# Altium schematic symbol library Regulator_Linear.SchLib: 1538 symbols (part 2 of 9) (continued)
## AZ1117-2.5 (continued)

## AZ1117-2.85
designator *  value AZ1117-2.85  Reference: U
ki_keywords: Fixed Voltage Regulator 1A Positive LDO; ki_description: 1A 20V Fixed LDO Linear Regulator, 2.85V, SOT-89/SOT-223/TO-220/TO-252/TO-263; ki_fp_filters: SOT?223* SOT?89* TO?220* TO?252* TO?263*; Datasheet: https://www.diodes.com/assets/Datasheets/AZ1117.pdf
pins: 1 GND, 2 VO, 3 VI

## AZ1117-3.3
designator *  value AZ1117-3.3  Reference: U
ki_keywords: Fixed Voltage Regulator 1A Positive LDO; ki_description: 1A 20V Fixed LDO Linear Regulator, 3.3V, SOT-89/SOT-223/TO-220/TO-252/TO-263; ki_fp_filters: SOT?223* SOT?89* TO?220* TO?252* TO?263*; Datasheet: https://www.diodes.com/assets/Datasheets/AZ1117.pdf
pins: 1 GND, 2 VO, 3 VI

## AZ1117-5.0
designator *  value AZ1117-5.0  Reference: U
ki_keywords: Fixed Voltage Regulator 1A Positive LDO; ki_description: 1A 20V Fixed LDO Linear Regulator, 5.0V, SOT-89/SOT-223/TO-220/TO-252/TO-263; ki_fp_filters: SOT?223* SOT?89* TO?220* TO?252* TO?263*; Datasheet: https://www.diodes.com/assets/Datasheets/AZ1117.pdf
pins: 1 GND, 2 VO, 3 VI

## AZ1117-ADJ
designator *  value AZ1117-ADJ  Reference: U
ki_keywords: Adjustable Voltage Regulator 1A Positive LDO; ki_description: 1A 20V Adjustable LDO Linear Regulator, SOT-89/SOT-223/TO-220/TO-252/TO-263; ki_fp_filters: SOT?223* SOT?89* TO?220* TO?252* TO?263*; Datasheet: https://www.diodes.com/assets/Datasheets/AZ1117.pdf
pins: 1 ADJ, 2 VO, 3 VI

## AZ1117D-ADJ
designator *  value AZ1117D-ADJ  Reference: U
ki_keywords: Adjustable Voltage Regulator 1A Positive LDO; ki_description: 1A 20V Adjustable LDO Linear Regulator, TO-252; ki_fp_filters: TO?252*; Footprint: Package_TO_SOT_SMD:TO-252-2; Datasheet: https://www.diodes.com/assets/Datasheets/products_inactive_data/AZ1117.pdf
pins: 1 ADJ, 2 VO, 3 VI

## AZ1117H-ADJ
designator *  value AZ1117H-ADJ  Reference: U
ki_keywords: Adjustable Voltage Regulator 1A Positive LDO; ki_description: 1A 20V Adjustable LDO Linear Regulator, SOT-223; ki_fp_filters: SOT?223*TabPin2*; Footprint: Package_TO_SOT_SMD:SOT-223-3_TabPin2; Datasheet: https://www.diodes.com/assets/Datasheets/products_inactive_data/AZ1117.pdf
pins: 1 ADJ, 2 VO, 3 VI

## AZ1117R-ADJ
designator *  value AZ1117R-ADJ  Reference: U
ki_keywords: Adjustable Voltage Regulator 1A Positive LDO; ki_description: 1A 20V Adjustable LDO Linear Regulator, SOT-89; ki_fp_filters: SOT?89*; Footprint: Package_TO_SOT_SMD:SOT-89-3; Datasheet: https://www.diodes.com/assets/Datasheets/products_inactive_data/AZ1117.pdf
pins: 1 ADJ, 2 VO, 3 VI

## AZ1117S-ADJ
designator *  value AZ1117S-ADJ  Reference: U
ki_keywords: Adjustable Voltage Regulator 1A Positive LDO; ki_description: 1A 20V Adjustable LDO Linear Regulator, TO-263; ki_fp_filters: TO?263*; Footprint: Package_TO_SOT_SMD:TO-263-2; Datasheet: https://www.diodes.com/assets/Datasheets/products_inactive_data/AZ1117.pdf
pins: 1 ADJ, 2 VO, 3 VI

## AZ1117T-ADJ
designator *  value AZ1117T-ADJ  Reference: U
ki_keywords: Adjustable Voltage Regulator 1A Positive LDO; ki_description: 1A 20V Adjustable LDO Linear Regulator, TO-220; ki_fp_filters: TO?220*; Footprint: Package_TO_SOT_THT:TO-220-3_Vertical; Datasheet: https://www.diodes.com/assets/Datasheets/products_inactive_data/AZ1117.pdf
pins: 1 ADJ, 2 VO, 3 VI

## BD00FC0WEFJ
designator *  value BD00FC0WEFJ  Reference: U
ki_keywords: linear regulator variable positive over voltage protection thermal shutdown; ki_description: 1A, variable LDO regulator with OVP & TSP, with enable, HTSOP-J8; ki_fp_filters: HTSOP*1EP*3.9x4.9mm*P1.27mm*; Footprint: Package_SO:HTSOP-8-1EP_3.9x4.9mm_P1.27mm_EP2.4x3.2mm; Datasheet: https://fscdn.rohm.com/en/products/databook/datasheet/ic/power/linear_regulator/bdxxfc0wefj-e.pdf
pins: 1 VO, 2 FB, 3 GND, 4 NC hidden, 5 EN, 6 NC hidden, 7 NC hidden, 8 VCC, 9 GND hidden

## BD00FC0WFP
designator *  value BD00FC0WFP  Reference: U
ki_keywords: linear regulator variable positive over voltage protection thermal shutdown; ki_description: 1A, variable LDO regulator with OVP & TSP, with enable, TO-252; ki_fp_filters: TO?252*; Footprint: Package_TO_SOT_SMD:TO-252-4; Datasheet: https://fscdn.rohm.com/en/products/databook/datasheet/ic/power/linear_regulator/bdxxfc0wefj-e.pdf
pins: 1 EN, 2 VCC, 3 GND, 4 VO, 5 FB

## BD15GA3WEFJ
designator *  value BD15GA3WEFJ  Reference: U
ki_keywords: linear regulator fixed positive over voltage protection thermal shutdown; ki_description: 300mA, 1.5V LDO regulator with OVP & TSP, HTSOP-8; ki_fp_filters: HTSOP*1EP*3.9x4.9mm*P1.27mm*; Footprint: Package_SO:HTSOP-8-1EP_3.9x4.9mm_P1.27mm_EP2.4x3.2mm; Datasheet: http://rohmfs.rohm.com/en/products/databook/datasheet/ic/power/linear_regulator/bdxxga3wefj-e.pdf
pins: 1 VO, 2 Vo_s, 3 GND, 4 GND hidden, 5 EN, 6 GND hidden, 7 GND hidden, 8 VCC, 9 GND hidden

## BD15GA5WEFJ
designator *  value BD15GA5WEFJ  Reference: U
ki_keywords: linear regulator fixed positive over voltage protection thermal shutdown; ki_description: 500mA, 1.5V LDO regulator with OVP & TSP, HTSOP-8; ki_fp_filters: HTSOP*1EP*3.9x4.9mm*P1.27mm*; Footprint: Package_SO:HTSOP-8-1EP_3.9x4.9mm_P1.27mm_EP2.4x3.2mm; Datasheet: http://rohmfs.rohm.com/en/products/databook/datasheet/ic/power/linear_regulator/bdxxga5wefj-e.pdf
pins: 1 VO, 2 Vo_s, 3 GND, 4 GND hidden, 5 EN, 6 GND hidden, 7 GND hidden, 8 VCC, 9 GND hidden

## BD18GA3WEFJ
designator *  value BD18GA3WEFJ  Reference: U
ki_keywords: linear regulator fixed positive over voltage protection thermal shutdown; ki_description: 300mA, 1.8V LDO regulator with OVP & TSP, HTSOP-8; ki_fp_filters: HTSOP*1EP*3.9x4.9mm*P1.27mm*; Footprint: Package_SO:HTSOP-8-1EP_3.9x4.9mm_P1.27mm_EP2.4x3.2mm; Datasheet: http://rohmfs.rohm.com/en/products/databook/datasheet/ic/power/linear_regulator/bdxxga3wefj-e.pdf
pins: 1 VO, 2 Vo_s, 3 GND, 4 GND hidden, 5 EN, 6 GND hidden, 7 GND hidden, 8 VCC, 9 GND hidden

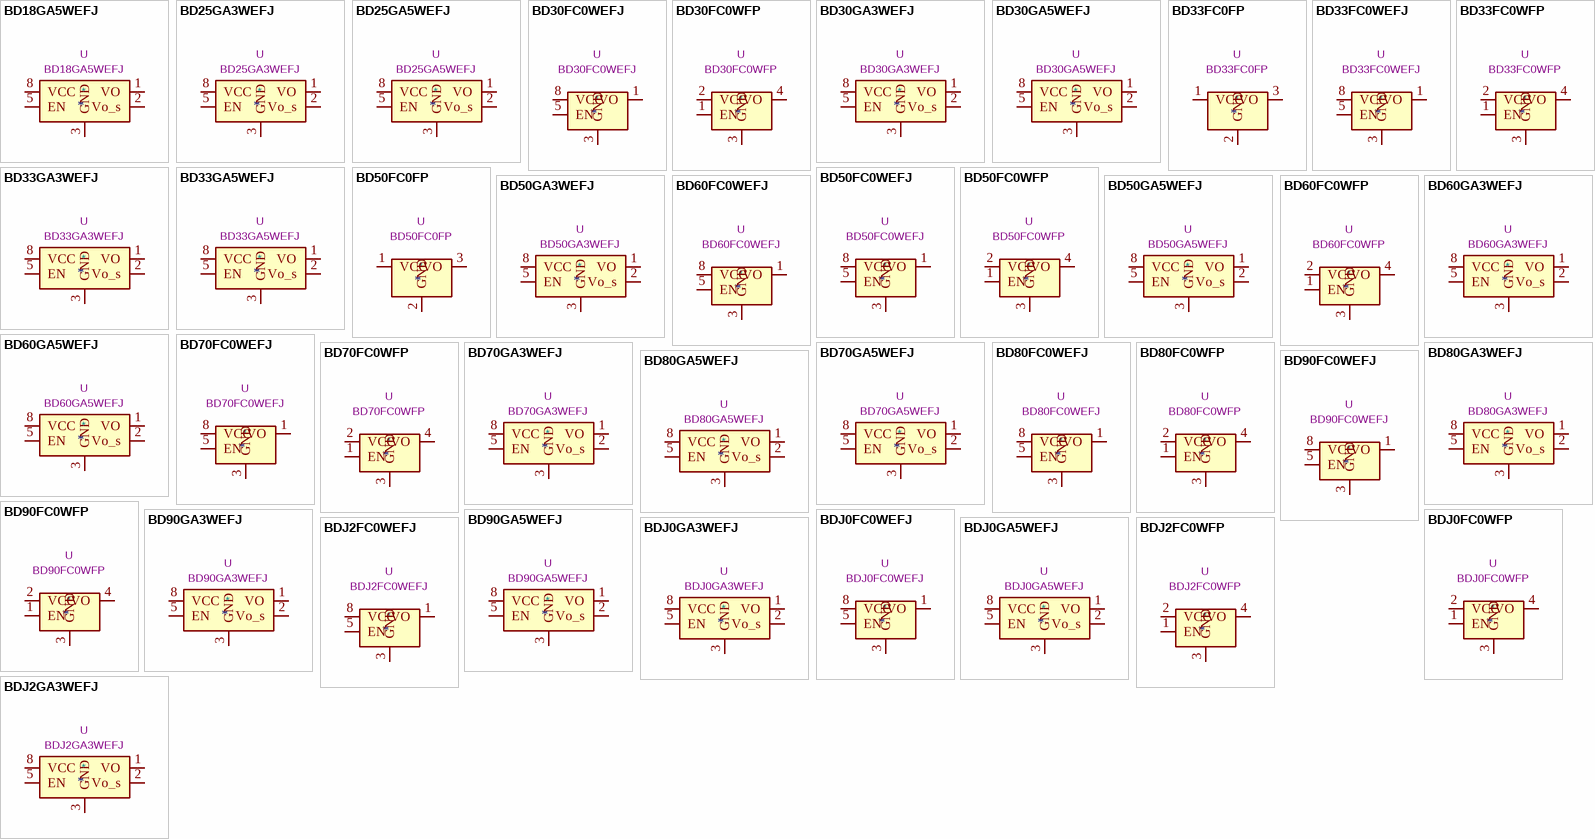
[diagram p7: symbols BD18GA5WEFJ to BDJ2GA3WEFJ]

## BD18GA5WEFJ
designator *  value BD18GA5WEFJ  Reference: U
ki_keywords: linear regulator fixed positive over voltage protection thermal shutdown; ki_description: 500mA, 1.8V LDO regulator with OVP & TSP, HTSOP-8; ki_fp_filters: HTSOP*1EP*3.9x4.9mm*P1.27mm*; Footprint: Package_SO:HTSOP-8-1EP_3.9x4.9mm_P1.27mm_EP2.4x3.2mm; Datasheet: http://rohmfs.rohm.com/en/products/databook/datasheet/ic/power/linear_regulator/bdxxga5wefj-e.pdf
pins: 1 VO, 2 Vo_s, 3 GND, 4 GND hidden, 5 EN, 6 GND hidden, 7 GND hidden, 8 VCC, 9 GND hidden

## BD25GA3WEFJ
designator *  value BD25GA3WEFJ  Reference: U
ki_keywords: linear regulator fixed positive over voltage protection thermal shutdown; ki_description: 300mA, 2.5V LDO regulator with OVP & TSP, HTSOP-8; ki_fp_filters: HTSOP*1EP*3.9x4.9mm*P1.27mm*; Footprint: Package_SO:HTSOP-8-1EP_3.9x4.9mm_P1.27mm_EP2.4x3.2mm; Datasheet: http://rohmfs.rohm.com/en/products/databook/datasheet/ic/power/linear_regulator/bdxxga3wefj-e.pdf
pins: 1 VO, 2 Vo_s, 3 GND, 4 GND hidden, 5 EN, 6 GND hidden, 7 GND hidden, 8 VCC, 9 GND hidden

## BD25GA5WEFJ
designator *  value BD25GA5WEFJ  Reference: U
ki_keywords: linear regulator fixed positive over voltage protection thermal shutdown; ki_description: 500mA, 2.5V LDO regulator with OVP & TSP, HTSOP-8; ki_fp_filters: HTSOP*1EP*3.9x4.9mm*P1.27mm*; Footprint: Package_SO:HTSOP-8-1EP_3.9x4.9mm_P1.27mm_EP2.4x3.2mm; Datasheet: http://rohmfs.rohm.com/en/products/databook/datasheet/ic/power/linear_regulator/bdxxga5wefj-e.pdf
pins: 1 VO, 2 Vo_s, 3 GND, 4 GND hidden, 5 EN, 6 GND hidden, 7 GND hidden, 8 VCC, 9 GND hidden

## BD30FC0WEFJ
designator *  value BD30FC0WEFJ  Reference: U
ki_keywords: linear regulator fixed positive over voltage protection thermal shutdown; ki_description: 1A, 3.0V LDO regulator with OVP & TSP, with enable, HTSOP-J8; ki_fp_filters: HTSOP*1EP*3.9x4.9mm*P1.27mm*; Footprint: Package_SO:HTSOP-8-1EP_3.9x4.9mm_P1.27mm_EP2.4x3.2mm; Datasheet: https://fscdn.rohm.com/en/products/databook/datasheet/ic/power/linear_regulator/bdxxfc0wefj-e.pdf
pins: 1 VO, 2 NC hidden, 3 GND, 4 NC hidden, 5 EN, 6 NC hidden, 7 NC hidden, 8 VCC, 9 GND hidden

## BD30FC0WFP
designator *  value BD30FC0WFP  Reference: U
ki_keywords: linear regulator fixed positive over voltage protection thermal shutdown; ki_description: 1A, 3.0V LDO regulator with OVP & TSP, with enable, TO-252; ki_fp_filters: TO?252*; Footprint: Package_TO_SOT_SMD:TO-252-4; Datasheet: https://fscdn.rohm.com/en/products/databook/datasheet/ic/power/linear_regulator/bdxxfc0wefj-e.pdf
pins: 1 EN, 2 VCC, 3 GND, 4 VO, 5 NC hidden

## BD30GA3WEFJ
designator *  value BD30GA3WEFJ  Reference: U
ki_keywords: linear regulator fixed positive over voltage protection thermal shutdown; ki_description: 300mA, 3V LDO regulator with OVP & TSP, HTSOP-8; ki_fp_filters: HTSOP*1EP*3.9x4.9mm*P1.27mm*; Footprint: Package_SO:HTSOP-8-1EP_3.9x4.9mm_P1.27mm_EP2.4x3.2mm; Datasheet: http://rohmfs.rohm.com/en/products/databook/datasheet/ic/power/linear_regulator/bdxxga3wefj-e.pdf
pins: 1 VO, 2 Vo_s, 3 GND, 4 GND hidden, 5 EN, 6 GND hidden, 7 GND hidden, 8 VCC, 9 GND hidden

## BD30GA5WEFJ
designator *  value BD30GA5WEFJ  Reference: U
ki_keywords: linear regulator fixed positive over voltage protection thermal shutdown; ki_description: 500mA, 3V LDO regulator with OVP & TSP, HTSOP-8; ki_fp_filters: HTSOP*1EP*3.9x4.9mm*P1.27mm*; Footprint: Package_SO:HTSOP-8-1EP_3.9x4.9mm_P1.27mm_EP2.4x3.2mm; Datasheet: http://rohmfs.rohm.com/en/products/databook/datasheet/ic/power/linear_regulator/bdxxga5wefj-e.pdf
pins: 1 VO, 2 Vo_s, 3 GND, 4 GND hidden, 5 EN, 6 GND hidden, 7 GND hidden, 8 VCC, 9 GND hidden

## BD33FC0FP
designator *  value BD33FC0FP  Reference: U
ki_keywords: linear regulator fixed positive over voltage protection thermal shutdown; ki_description: 1A, 3.3V LDO regulator with OVP & TSP, without enable, TO-252; ki_fp_filters: TO?252*; Footprint: Package_TO_SOT_SMD:TO-252-2; Datasheet: https://fscdn.rohm.com/en/products/databook/datasheet/ic/power/linear_regulator/bdxxfc0wefj-e.pdf
pins: 1 VCC, 2 GND, 3 VO

## BD33FC0WEFJ
designator *  value BD33FC0WEFJ  Reference: U
ki_keywords: linear regulator fixed positive over voltage protection thermal shutdown; ki_description: 1A, 3.3V LDO regulator with OVP & TSP, with enable, HTSOP-J8; ki_fp_filters: HTSOP*1EP*3.9x4.9mm*P1.27mm*; Footprint: Package_SO:HTSOP-8-1EP_3.9x4.9mm_P1.27mm_EP2.4x3.2mm; Datasheet: https://fscdn.rohm.com/en/products/databook/datasheet/ic/power/linear_regulator/bdxxfc0wefj-e.pdf
pins: 1 VO, 2 NC hidden, 3 GND, 4 NC hidden, 5 EN, 6 NC hidden, 7 NC hidden, 8 VCC, 9 GND hidden

## BD33FC0WFP
designator *  value BD33FC0WFP  Reference: U
ki_keywords: linear regulator fixed positive over voltage protection thermal shutdown; ki_description: 1A, 3.3V LDO regulator with OVP & TSP, with enable, TO-252; ki_fp_filters: TO?252*; Footprint: Package_TO_SOT_SMD:TO-252-4; Datasheet: https://fscdn.rohm.com/en/products/databook/datasheet/ic/power/linear_regulator/bdxxfc0wefj-e.pdf
pins: 1 EN, 2 VCC, 3 GND, 4 VO, 5 NC hidden

## BD33GA3WEFJ
designator *  value BD33GA3WEFJ  Reference: U
ki_keywords: linear regulator fixed positive over voltage protection thermal shutdown; ki_description: 300mA, 3.3V LDO regulator with OVP & TSP, HTSOP-8; ki_fp_filters: HTSOP*1EP*3.9x4.9mm*P1.27mm*; Footprint: Package_SO:HTSOP-8-1EP_3.9x4.9mm_P1.27mm_EP2.4x3.2mm; Datasheet: http://rohmfs.rohm.com/en/products/databook/datasheet/ic/power/linear_regulator/bdxxga3wefj-e.pdf
pins: 1 VO, 2 Vo_s, 3 GND, 4 GND hidden, 5 EN, 6 GND hidden, 7 GND hidden, 8 VCC, 9 GND hidden

## BD33GA5WEFJ
designator *  value BD33GA5WEFJ  Reference: U
ki_keywords: linear regulator fixed positive over voltage protection thermal shutdown; ki_description: 500mA, 3.3V LDO regulator with OVP & TSP, HTSOP-8; ki_fp_filters: HTSOP*1EP*3.9x4.9mm*P1.27mm*; Footprint: Package_SO:HTSOP-8-1EP_3.9x4.9mm_P1.27mm_EP2.4x3.2mm; Datasheet: http://rohmfs.rohm.com/en/products/databook/datasheet/ic/power/linear_regulator/bdxxga5wefj-e.pdf
pins: 1 VO, 2 Vo_s, 3 GND, 4 GND hidden, 5 EN, 6 GND hidden, 7 GND hidden, 8 VCC, 9 GND hidden

## BD50FC0FP
designator *  value BD50FC0FP  Reference: U
ki_keywords: linear regulator fixed positive over voltage protection thermal shutdown; ki_description: 1A, 5.0V LDO regulator with OVP & TSP, without enable, TO-252; ki_fp_filters: TO?252*; Footprint: Package_TO_SOT_SMD:TO-252-2; Datasheet: https://fscdn.rohm.com/en/products/databook/datasheet/ic/power/linear_regulator/bdxxfc0wefj-e.pdf
pins: 1 VCC, 2 GND, 3 VO

## BD50FC0WEFJ
designator *  value BD50FC0WEFJ  Reference: U
ki_keywords: linear regulator fixed positive over voltage protection thermal shutdown; ki_description: 1A, 5.0V LDO regulator with OVP & TSP, with enable, HTSOP-J8; ki_fp_filters: HTSOP*1EP*3.9x4.9mm*P1.27mm*; Footprint: Package_SO:HTSOP-8-1EP_3.9x4.9mm_P1.27mm_EP2.4x3.2mm; Datasheet: https://fscdn.rohm.com/en/products/databook/datasheet/ic/power/linear_regulator/bdxxfc0wefj-e.pdf
pins: 1 VO, 2 NC hidden, 3 GND, 4 NC hidden, 5 EN, 6 NC hidden, 7 NC hidden, 8 VCC, 9 GND hidden

## BD50FC0WFP
designator *  value BD50FC0WFP  Reference: U
ki_keywords: linear regulator fixed positive over voltage protection thermal shutdown; ki_description: 1A, 5.0V LDO regulator with OVP & TSP, with enable, TO-252; ki_fp_filters: TO?252*; Footprint: Package_TO_SOT_SMD:TO-252-4; Datasheet: https://fscdn.rohm.com/en/products/databook/datasheet/ic/power/linear_regulator/bdxxfc0wefj-e.pdf
pins: 1 EN, 2 VCC, 3 GND, 4 VO, 5 NC hidden

## BD50GA3WEFJ
designator *  value BD50GA3WEFJ  Reference: U
ki_keywords: linear regulator fixed positive over voltage protection thermal shutdown; ki_description: 300mA, 5V LDO regulator with OVP & TSP, HTSOP-8; ki_fp_filters: HTSOP*1EP*3.9x4.9mm*P1.27mm*; Footprint: Package_SO:HTSOP-8-1EP_3.9x4.9mm_P1.27mm_EP2.4x3.2mm; Datasheet: http://rohmfs.rohm.com/en/products/databook/datasheet/ic/power/linear_regulator/bdxxga3wefj-e.pdf
pins: 1 VO, 2 Vo_s, 3 GND, 4 GND hidden, 5 EN, 6 GND hidden, 7 GND hidden, 8 VCC, 9 GND hidden

## BD50GA5WEFJ
designator *  value BD50GA5WEFJ  Reference: U
ki_keywords: linear regulator fixed positive over voltage protection thermal shutdown; ki_description: 500mA, 5V LDO regulator with OVP & TSP, HTSOP-8; ki_fp_filters: HTSOP*1EP*3.9x4.9mm*P1.27mm*; Footprint: Package_SO:HTSOP-8-1EP_3.9x4.9mm_P1.27mm_EP2.4x3.2mm; Datasheet: http://rohmfs.rohm.com/en/products/databook/datasheet/ic/power/linear_regulator/bdxxga5wefj-e.pdf
pins: 1 VO, 2 Vo_s, 3 GND, 4 GND hidden, 5 EN, 6 GND hidden, 7 GND hidden, 8 VCC, 9 GND hidden

## BD60FC0WEFJ
designator *  value BD60FC0WEFJ  Reference: U
ki_keywords: linear regulator fixed positive over voltage protection thermal shutdown; ki_description: 1A, 6.0V LDO regulator with OVP & TSP, with enable, HTSOP-J8; ki_fp_filters: HTSOP*1EP*3.9x4.9mm*P1.27mm*; Footprint: Package_SO:HTSOP-8-1EP_3.9x4.9mm_P1.27mm_EP2.4x3.2mm; Datasheet: https://fscdn.rohm.com/en/products/databook/datasheet/ic/power/linear_regulator/bdxxfc0wefj-e.pdf
pins: 1 VO, 2 NC hidden, 3 GND, 4 NC hidden, 5 EN, 6 NC hidden, 7 NC hidden, 8 VCC, 9 GND hidden

## BD60FC0WFP
designator *  value BD60FC0WFP  Reference: U
ki_keywords: linear regulator fixed positive over voltage protection thermal shutdown; ki_description: 1A, 6.0V LDO regulator with OVP & TSP, with enable, TO-252; ki_fp_filters: TO?252*; Footprint: Package_TO_SOT_SMD:TO-252-4; Datasheet: https://fscdn.rohm.com/en/products/databook/datasheet/ic/power/linear_regulator/bdxxfc0wefj-e.pdf
pins: 1 EN, 2 VCC, 3 GND, 4 VO, 5 NC hidden

## BD60GA3WEFJ
designator *  value BD60GA3WEFJ  Reference: U
ki_keywords: linear regulator fixed positive over voltage protection thermal shutdown; ki_description: 300mA, 6V LDO regulator with OVP & TSP, HTSOP-8; ki_fp_filters: HTSOP*1EP*3.9x4.9mm*P1.27mm*; Footprint: Package_SO:HTSOP-8-1EP_3.9x4.9mm_P1.27mm_EP2.4x3.2mm; Datasheet: http://rohmfs.rohm.com/en/products/databook/datasheet/ic/power/linear_regulator/bdxxga3wefj-e.pdf
pins: 1 VO, 2 Vo_s, 3 GND, 4 GND hidden, 5 EN, 6 GND hidden, 7 GND hidden, 8 VCC, 9 GND hidden

## BD60GA5WEFJ
designator *  value BD60GA5WEFJ  Reference: U
ki_keywords: linear regulator fixed positive over voltage protection thermal shutdown; ki_description: 500mA, 6V LDO regulator with OVP & TSP, HTSOP-8; ki_fp_filters: HTSOP*1EP*3.9x4.9mm*P1.27mm*; Footprint: Package_SO:HTSOP-8-1EP_3.9x4.9mm_P1.27mm_EP2.4x3.2mm; Datasheet: http://rohmfs.rohm.com/en/products/databook/datasheet/ic/power/linear_regulator/bdxxga5wefj-e.pdf
pins: 1 VO, 2 Vo_s, 3 GND, 4 GND hidden, 5 EN, 6 GND hidden, 7 GND hidden, 8 VCC, 9 GND hidden

## BD70FC0WEFJ
designator *  value BD70FC0WEFJ  Reference: U
ki_keywords: linear regulator fixed positive over voltage protection thermal shutdown; ki_description: 1A, 7.0V LDO regulator with OVP & TSP, with enable, HTSOP-J8; ki_fp_filters: HTSOP*1EP*3.9x4.9mm*P1.27mm*; Footprint: Package_SO:HTSOP-8-1EP_3.9x4.9mm_P1.27mm_EP2.4x3.2mm; Datasheet: https://fscdn.rohm.com/en/products/databook/datasheet/ic/power/linear_regulator/bdxxfc0wefj-e.pdf
pins: 1 VO, 2 NC hidden, 3 GND, 4 NC hidden, 5 EN, 6 NC hidden, 7 NC hidden, 8 VCC, 9 GND hidden

## BD70FC0WFP
designator *  value BD70FC0WFP  Reference: U
ki_keywords: linear regulator fixed positive over voltage protection thermal shutdown; ki_description: 1A, 7.0V LDO regulator with OVP & TSP, with enable, TO-252; ki_fp_filters: TO?252*; Footprint: Package_TO_SOT_SMD:TO-252-4; Datasheet: https://fscdn.rohm.com/en/products/databook/datasheet/ic/power/linear_regulator/bdxxfc0wefj-e.pdf
pins: 1 EN, 2 VCC, 3 GND, 4 VO, 5 NC hidden

## BD70GA3WEFJ
designator *  value BD70GA3WEFJ  Reference: U
ki_keywords: linear regulator fixed positive over voltage protection thermal shutdown; ki_description: 300mA, 7V LDO regulator with OVP & TSP, HTSOP-8; ki_fp_filters: HTSOP*1EP*3.9x4.9mm*P1.27mm*; Footprint: Package_SO:HTSOP-8-1EP_3.9x4.9mm_P1.27mm_EP2.4x3.2mm; Datasheet: http://rohmfs.rohm.com/en/products/databook/datasheet/ic/power/linear_regulator/bdxxga3wefj-e.pdf
pins: 1 VO, 2 Vo_s, 3 GND, 4 GND hidden, 5 EN, 6 GND hidden, 7 GND hidden, 8 VCC, 9 GND hidden

## BD70GA5WEFJ
designator *  value BD70GA5WEFJ  Reference: U
ki_keywords: linear regulator fixed positive over voltage protection thermal shutdown; ki_description: 500mA, 7V LDO regulator with OVP & TSP, HTSOP-8; ki_fp_filters: HTSOP*1EP*3.9x4.9mm*P1.27mm*; Footprint: Package_SO:HTSOP-8-1EP_3.9x4.9mm_P1.27mm_EP2.4x3.2mm; Datasheet: http://rohmfs.rohm.com/en/products/databook/datasheet/ic/power/linear_regulator/bdxxga5wefj-e.pdf
pins: 1 VO, 2 Vo_s, 3 GND, 4 GND hidden, 5 EN, 6 GND hidden, 7 GND hidden, 8 VCC, 9 GND hidden

## BD80FC0WEFJ
designator *  value BD80FC0WEFJ  Reference: U
ki_keywords: linear regulator fixed positive over voltage protection thermal shutdown; ki_description: 1A, 8.0V LDO regulator with OVP & TSP, with enable, HTSOP-J8; ki_fp_filters: HTSOP*1EP*3.9x4.9mm*P1.27mm*; Footprint: Package_SO:HTSOP-8-1EP_3.9x4.9mm_P1.27mm_EP2.4x3.2mm; Datasheet: https://fscdn.rohm.com/en/products/databook/datasheet/ic/power/linear_regulator/bdxxfc0wefj-e.pdf
pins: 1 VO, 2 NC hidden, 3 GND, 4 NC hidden, 5 EN, 6 NC hidden, 7 NC hidden, 8 VCC, 9 GND hidden

## BD80FC0WFP
designator *  value BD80FC0WFP  Reference: U
ki_keywords: linear regulator fixed positive over voltage protection thermal shutdown; ki_description: 1A, 8.0V LDO regulator with OVP & TSP, with enable, TO-252; ki_fp_filters: TO?252*; Footprint: Package_TO_SOT_SMD:TO-252-4; Datasheet: https://fscdn.rohm.com/en/products/databook/datasheet/ic/power/linear_regulator/bdxxfc0wefj-e.pdf
pins: 1 EN, 2 VCC, 3 GND, 4 VO, 5 NC hidden

## BD80GA3WEFJ
designator *  value BD80GA3WEFJ  Reference: U
ki_keywords: linear regulator fixed positive over voltage protection thermal shutdown; ki_description: 300mA, 8V LDO regulator with OVP & TSP, HTSOP-8; ki_fp_filters: HTSOP*1EP*3.9x4.9mm*P1.27mm*; Footprint: Package_SO:HTSOP-8-1EP_3.9x4.9mm_P1.27mm_EP2.4x3.2mm; Datasheet: http://rohmfs.rohm.com/en/products/databook/datasheet/ic/power/linear_regulator/bdxxga3wefj-e.pdf
pins: 1 VO, 2 Vo_s, 3 GND, 4 GND hidden, 5 EN, 6 GND hidden, 7 GND hidden, 8 VCC, 9 GND hidden

## BD80GA5WEFJ
designator *  value BD80GA5WEFJ  Reference: U
ki_keywords: linear regulator fixed positive over voltage protection thermal shutdown; ki_description: 500mA, 8V LDO regulator with OVP & TSP, HTSOP-8; ki_fp_filters: HTSOP*1EP*3.9x4.9mm*P1.27mm*; Footprint: Package_SO:HTSOP-8-1EP_3.9x4.9mm_P1.27mm_EP2.4x3.2mm; Datasheet: http://rohmfs.rohm.com/en/products/databook/datasheet/ic/power/linear_regulator/bdxxga5wefj-e.pdf
pins: 1 VO, 2 Vo_s, 3 GND, 4 GND hidden, 5 EN, 6 GND hidden, 7 GND hidden, 8 VCC, 9 GND hidden

## BD90FC0WEFJ
designator *  value BD90FC0WEFJ  Reference: U
ki_keywords: linear regulator fixed positive over voltage protection thermal shutdown; ki_description: 1A, 9.0V LDO regulator with OVP & TSP, with enable, HTSOP-J8; ki_fp_filters: HTSOP*1EP*3.9x4.9mm*P1.27mm*; Footprint: Package_SO:HTSOP-8-1EP_3.9x4.9mm_P1.27mm_EP2.4x3.2mm; Datasheet: https://fscdn.rohm.com/en/products/databook/datasheet/ic/power/linear_regulator/bdxxfc0wefj-e.pdf
pins: 1 VO, 2 NC hidden, 3 GND, 4 NC hidden, 5 EN, 6 NC hidden, 7 NC hidden, 8 VCC, 9 GND hidden

## BD90FC0WFP
designator *  value BD90FC0WFP  Reference: U
ki_keywords: linear regulator fixed positive over voltage protection thermal shutdown; ki_description: 1A, 9.0V LDO regulator with OVP & TSP, with enable, TO-252; ki_fp_filters: TO?252*; Footprint: Package_TO_SOT_SMD:TO-252-4; Datasheet: https://fscdn.rohm.com/en/products/databook/datasheet/ic/power/linear_regulator/bdxxfc0wefj-e.pdf
pins: 1 EN, 2 VCC, 3 GND, 4 VO, 5 NC hidden

## BD90GA3WEFJ
designator *  value BD90GA3WEFJ  Reference: U
ki_keywords: linear regulator fixed positive over voltage protection thermal shutdown; ki_description: 300mA, 9V LDO regulator with OVP & TSP, HTSOP-8; ki_fp_filters: HTSOP*1EP*3.9x4.9mm*P1.27mm*; Footprint: Package_SO:HTSOP-8-1EP_3.9x4.9mm_P1.27mm_EP2.4x3.2mm; Datasheet: http://rohmfs.rohm.com/en/products/databook/datasheet/ic/power/linear_regulator/bdxxga3wefj-e.pdf
pins: 1 VO, 2 Vo_s, 3 GND, 4 GND hidden, 5 EN, 6 GND hidden, 7 GND hidden, 8 VCC, 9 GND hidden

## BD90GA5WEFJ
designator *  value BD90GA5WEFJ  Reference: U
ki_keywords: linear regulator fixed positive over voltage protection thermal shutdown; ki_description: 500mA, 9V LDO regulator with OVP & TSP, HTSOP-8; ki_fp_filters: HTSOP*1EP*3.9x4.9mm*P1.27mm*; Footprint: Package_SO:HTSOP-8-1EP_3.9x4.9mm_P1.27mm_EP2.4x3.2mm; Datasheet: http://rohmfs.rohm.com/en/products/databook/datasheet/ic/power/linear_regulator/bdxxga5wefj-e.pdf
pins: 1 VO, 2 Vo_s, 3 GND, 4 GND hidden, 5 EN, 6 GND hidden, 7 GND hidden, 8 VCC, 9 GND hidden

## BDJ0FC0WEFJ
designator *  value BDJ0FC0WEFJ  Reference: U
ki_keywords: linear regulator fixed positive over voltage protection thermal shutdown; ki_description: 1A, 10.0V LDO regulator with OVP & TSP, with enable, HTSOP-J8; ki_fp_filters: HTSOP*1EP*3.9x4.9mm*P1.27mm*; Footprint: Package_SO:HTSOP-8-1EP_3.9x4.9mm_P1.27mm_EP2.4x3.2mm; Datasheet: https://fscdn.rohm.com/en/products/databook/datasheet/ic/power/linear_regulator/bdxxfc0wefj-e.pdf
pins: 1 VO, 2 NC hidden, 3 GND, 4 NC hidden, 5 EN, 6 NC hidden, 7 NC hidden, 8 VCC, 9 GND hidden

## BDJ0FC0WFP
designator *  value BDJ0FC0WFP  Reference: U
ki_keywords: linear regulator fixed positive over voltage protection thermal shutdown; ki_description: 1A, 10.0V LDO regulator with OVP & TSP, with enable, TO-252; ki_fp_filters: TO?252*; Footprint: Package_TO_SOT_SMD:TO-252-4; Datasheet: https://fscdn.rohm.com/en/products/databook/datasheet/ic/power/linear_regulator/bdxxfc0wefj-e.pdf
pins: 1 EN, 2 VCC, 3 GND, 4 VO, 5 NC hidden

## BDJ0GA3WEFJ
designator *  value BDJ0GA3WEFJ  Reference: U
ki_keywords: linear regulator fixed positive over voltage protection thermal shutdown; ki_description: 300mA, 10V LDO regulator with OVP & TSP, HTSOP-8; ki_fp_filters: HTSOP*1EP*3.9x4.9mm*P1.27mm*; Footprint: Package_SO:HTSOP-8-1EP_3.9x4.9mm_P1.27mm_EP2.4x3.2mm; Datasheet: http://rohmfs.rohm.com/en/products/databook/datasheet/ic/power/linear_regulator/bdxxga3wefj-e.pdf
pins: 1 VO, 2 Vo_s, 3 GND, 4 GND hidden, 5 EN, 6 GND hidden, 7 GND hidden, 8 VCC, 9 GND hidden

## BDJ0GA5WEFJ
designator *  value BDJ0GA5WEFJ  Reference: U
ki_keywords: linear regulator fixed positive over voltage protection thermal shutdown; ki_description: 500mA, 10V LDO regulator with OVP & TSP, HTSOP-8; ki_fp_filters: HTSOP*1EP*3.9x4.9mm*P1.27mm*; Footprint: Package_SO:HTSOP-8-1EP_3.9x4.9mm_P1.27mm_EP2.4x3.2mm; Datasheet: http://rohmfs.rohm.com/en/products/databook/datasheet/ic/power/linear_regulator/bdxxga5wefj-e.pdf
pins: 1 VO, 2 Vo_s, 3 GND, 4 GND hidden, 5 EN, 6 GND hidden, 7 GND hidden, 8 VCC, 9 GND hidden

## BDJ2FC0WEFJ
designator *  value BDJ2FC0WEFJ  Reference: U
ki_keywords: linear regulator fixed positive over voltage protection thermal shutdown; ki_description: 1A, 12.0V LDO regulator with OVP & TSP, with enable, HTSOP-J8; ki_fp_filters: HTSOP*1EP*3.9x4.9mm*P1.27mm*; Footprint: Package_SO:HTSOP-8-1EP_3.9x4.9mm_P1.27mm_EP2.4x3.2mm; Datasheet: https://fscdn.rohm.com/en/products/databook/datasheet/ic/power/linear_regulator/bdxxfc0wefj-e.pdf
pins: 1 VO, 2 NC hidden, 3 GND, 4 NC hidden, 5 EN, 6 NC hidden, 7 NC hidden, 8 VCC, 9 GND hidden

## BDJ2FC0WFP
designator *  value BDJ2FC0WFP  Reference: U
ki_keywords: linear regulator fixed positive over voltage protection thermal shutdown; ki_description: 1A, 12.0V LDO regulator with OVP & TSP, with enable, TO-252; ki_fp_filters: TO?252*; Footprint: Package_TO_SOT_SMD:TO-252-4; Datasheet: https://fscdn.rohm.com/en/products/databook/datasheet/ic/power/linear_regulator/bdxxfc0wefj-e.pdf
pins: 1 EN, 2 VCC, 3 GND, 4 VO, 5 NC hidden

## BDJ2GA3WEFJ
designator *  value BDJ2GA3WEFJ  Reference: U
ki_keywords: linear regulator fixed positive over voltage protection thermal shutdown; ki_description: 300mA, 12V LDO regulator with OVP & TSP, HTSOP-8; ki_fp_filters: HTSOP*1EP*3.9x4.9mm*P1.27mm*; Footprint: Package_SO:HTSOP-8-1EP_3.9x4.9mm_P1.27mm_EP2.4x3.2mm; Datasheet: http://rohmfs.rohm.com/en/products/databook/datasheet/ic/power/linear_regulator/bdxxga3wefj-e.pdf
pins: 1 VO, 2 Vo_s, 3 GND, 4 GND hidden, 5 EN, 6 GND hidden, 7 GND hidden, 8 VCC, 9 GND hidden

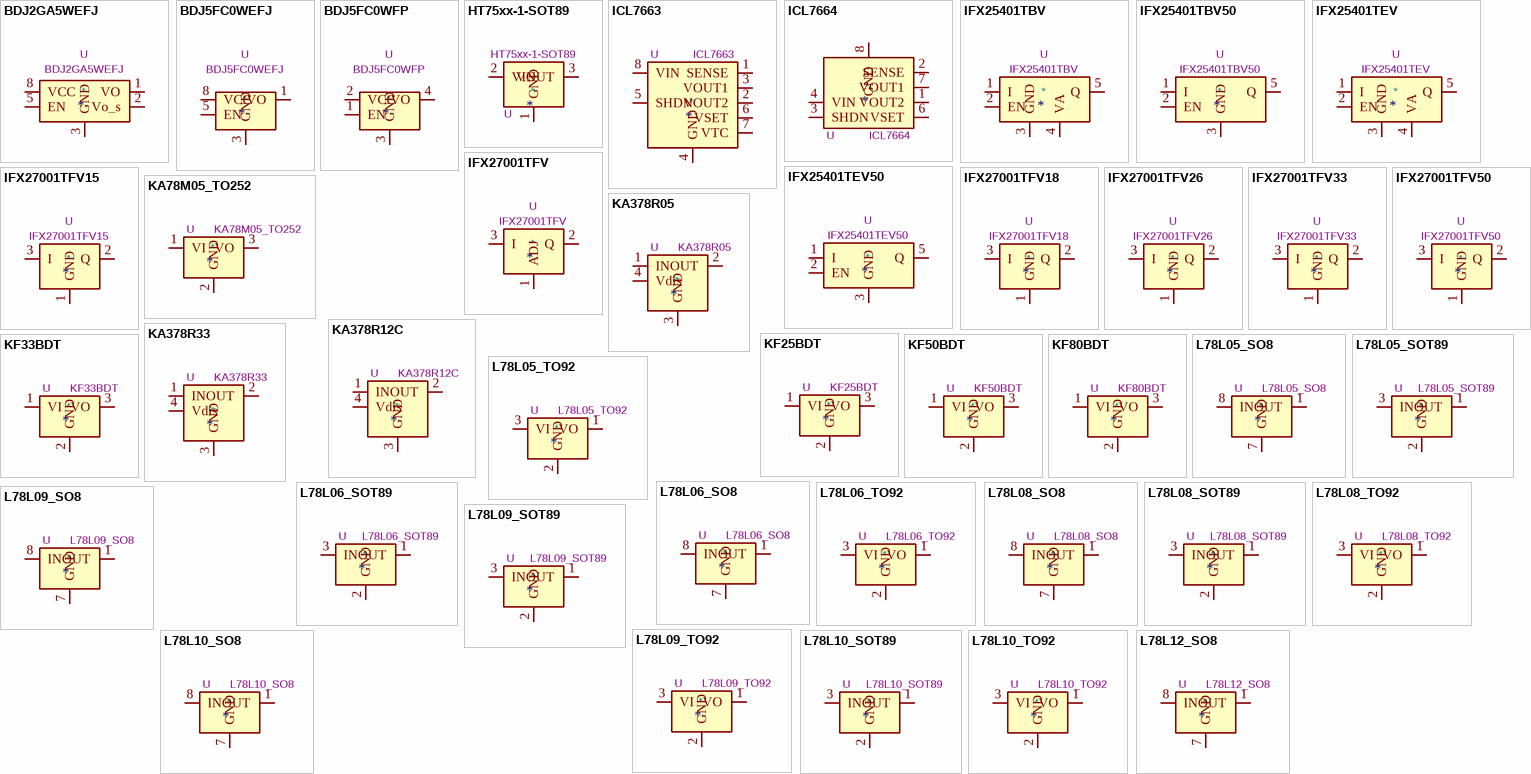
[diagram p8: symbols BDJ2GA5WEFJ to L78L12_SO8]

## BDJ2GA5WEFJ
designator *  value BDJ2GA5WEFJ  Reference: U
ki_keywords: linear regulator fixed positive over voltage protection thermal shutdown; ki_description: 500mA, 12V LDO regulator with OVP & TSP, HTSOP-8; ki_fp_filters: HTSOP*1EP*3.9x4.9mm*P1.27mm*; Footprint: Package_SO:HTSOP-8-1EP_3.9x4.9mm_P1.27mm_EP2.4x3.2mm; Datasheet: http://rohmfs.rohm.com/en/products/databook/datasheet/ic/power/linear_regulator/bdxxga5wefj-e.pdf
pins: 1 VO, 2 Vo_s, 3 GND, 4 GND hidden, 5 EN, 6 GND hidden, 7 GND hidden, 8 VCC, 9 GND hidden

## BDJ5FC0WEFJ
designator *  value BDJ5FC0WEFJ  Reference: U
ki_keywords: linear regulator fixed positive over voltage protection thermal shutdown; ki_description: 1A, 15.0V LDO regulator with OVP & TSP, with enable, HTSOP-J8; ki_fp_filters: HTSOP*1EP*3.9x4.9mm*P1.27mm*; Footprint: Package_SO:HTSOP-8-1EP_3.9x4.9mm_P1.27mm_EP2.4x3.2mm; Datasheet: https://fscdn.rohm.com/en/products/databook/datasheet/ic/power/linear_regulator/bdxxfc0wefj-e.pdf
pins: 1 VO, 2 NC hidden, 3 GND, 4 NC hidden, 5 EN, 6 NC hidden, 7 NC hidden, 8 VCC, 9 GND hidden

## BDJ5FC0WFP
designator *  value BDJ5FC0WFP  Reference: U
ki_keywords: linear regulator fixed positive over voltage protection thermal shutdown; ki_description: 1A, 15.0V LDO regulator with OVP & TSP, with enable, TO-252; ki_fp_filters: TO?252*; Footprint: Package_TO_SOT_SMD:TO-252-4; Datasheet: https://fscdn.rohm.com/en/products/databook/datasheet/ic/power/linear_regulator/bdxxfc0wefj-e.pdf
pins: 1 EN, 2 VCC, 3 GND, 4 VO, 5 NC hidden

## HT75xx-1-SOT89
designator *  value HT75xx-1-SOT89  Reference: U
ki_keywords: 100mA LDO Regulator Fixed Positive; ki_description: 100mA Low Dropout Voltage Regulator, Fixed Output, SOT89; ki_fp_filters: SOT?89*; Footprint: Package_TO_SOT_SMD:SOT-89-3; Datasheet: https://www.holtek.com/documents/10179/116711/HT75xx-1v250.pdf
pins: 1 GND, 2 VIN, 3 VOUT

## ICL7663
designator *  value ICL7663  Reference: U
ki_keywords: Linear Regulator 50mA 5V fixed; ki_description: 50mA 5V/Programmable Voltage Regulator, DIP-8/SO-8/TO-99; ki_fp_filters: DIP*W7.62mm* SOIC*3.9x4.9mm*P1.27mm* TO?99*; Datasheet: https://datasheets.maximintegrated.com/en/ds/ICL7663.pdf
pins: 1 SENSE, 2 VOUT2, 3 VOUT1, 4 GND, 5 SHDN, 6 VSET, 7 VTC, 8 VIN

## ICL7664
designator *  value ICL7664  Reference: U
ki_keywords: Linear Regulator 50mA -5V fixed negative; ki_description: 50mA Dual Mode -5V/Programmable Negative Voltage Regulator, DIP-8/SO-8/TO-99; ki_fp_filters: DIP*W7.62mm* SOIC*3.9x4.9mm*P1.27mm* TO?99*; Datasheet: http://pe2bz.philpem.me.uk/pdf%20on%20typenumber/I-L/ICL7664.pdf
pins: 1 VOUT2, 2 SENSE, 3 SHDN, 4 VIN, 5 SHDN hidden, 6 VSET, 7 VOUT1, 8 GND

## IFX25401TBV
designator *  value IFX25401TBV  Reference: U
ki_keywords: adjustable LDO positive voltage regulator; ki_description: Adjustable LDO Linear Voltage Regulator (TO-263-5); ki_fp_filters: TO?263*TabPin3*; Footprint: Package_TO_SOT_SMD:TO-263-5_TabPin3; Datasheet: https://www.infineon.com/dgdl/Infineon-IFX25401-DS-v01_02-en.pdf?fileId=db3a304320d39d590120f62a690569f7
pins: 1 I, 2 EN, 3 GND, 4 VA, 5 Q

## IFX25401TBV50
designator *  value IFX25401TBV50  Reference: U
ki_keywords: fixed ldo positive voltage regulator; ki_description: Fixed 5V LDO Linear Voltage Regulator (TO-263-5); ki_fp_filters: TO?263*TabPin3*; Footprint: Package_TO_SOT_SMD:TO-263-5_TabPin3; Datasheet: https://www.infineon.com/dgdl/Infineon-IFX25401-DS-v01_02-en.pdf?fileId=db3a304320d39d590120f62a690569f7
pins: 1 I, 2 EN, 3 GND, 4 NC hidden, 5 Q

## IFX25401TEV
designator *  value IFX25401TEV  Reference: U
ki_keywords: adjustable LDO positive voltage regulator; ki_description: Adjustable LDO Linear Voltage Regulator (TO-252-4); ki_fp_filters: TO*252*; Footprint: Package_TO_SOT_SMD:TO-252-4; Datasheet: https://www.infineon.com/dgdl/Infineon-IFX25401-DS-v01_02-en.pdf?fileId=db3a304320d39d590120f62a690569f7
pins: 1 I, 2 EN, 3 GND, 4 VA, 5 Q

## IFX25401TEV50
designator *  value IFX25401TEV50  Reference: U
ki_keywords: fixed ldo positive voltage regulator; ki_description: Fixed 5V LDO Linear Voltage Regulator (TO-252-4); ki_fp_filters: TO*252*; Footprint: Package_TO_SOT_SMD:TO-252-4; Datasheet: https://www.infineon.com/dgdl/Infineon-IFX25401-DS-v01_02-en.pdf?fileId=db3a304320d39d590120f62a690569f7
pins: 1 I, 2 EN, 3 GND, 4 NC hidden, 5 Q

## IFX27001TFV
designator *  value IFX27001TFV  Reference: U
ki_keywords: LDO positive voltage industrial; ki_description: 1A Low Dropout Regulator, positive, adjustable output, TO-252-3; ki_fp_filters: TO?252*; Footprint: Package_TO_SOT_SMD:TO-252-3_TabPin2; Datasheet: https://static6.arrow.com/aropdfconversion/dc75757ae45a88e5f69bdce3f2a651a5fe0ca07d/ifx27001_ds_10.pdf
pins: 1 ADJ, 2 Q, 3 I

## IFX27001TFV15
designator *  value IFX27001TFV15  Reference: U
ki_keywords: LDO positive voltage industrial; ki_description: 1A Low Dropout Regulator, positive, 1.5V fixed output, TO-252-3; ki_fp_filters: TO?252*; Footprint: Package_TO_SOT_SMD:TO-252-3_TabPin2; Datasheet: https://static6.arrow.com/aropdfconversion/dc75757ae45a88e5f69bdce3f2a651a5fe0ca07d/ifx27001_ds_10.pdf
pins: 1 GND, 2 Q, 3 I

## IFX27001TFV18
designator *  value IFX27001TFV18  Reference: U
ki_keywords: LDO positive voltage industrial; ki_description: 1A Low Dropout Regulator, positive, 1.8V fixed output, TO-252-3; ki_fp_filters: TO?252*; Footprint: Package_TO_SOT_SMD:TO-252-3_TabPin2; Datasheet: https://static6.arrow.com/aropdfconversion/dc75757ae45a88e5f69bdce3f2a651a5fe0ca07d/ifx27001_ds_10.pdf
pins: 1 GND, 2 Q, 3 I

## IFX27001TFV26
designator *  value IFX27001TFV26  Reference: U
ki_keywords: LDO positive voltage industrial; ki_description: 1A Low Dropout Regulator, positive, 2.6V fixed output, TO-252-3; ki_fp_filters: TO?252*; Footprint: Package_TO_SOT_SMD:TO-252-3_TabPin2; Datasheet: https://static6.arrow.com/aropdfconversion/dc75757ae45a88e5f69bdce3f2a651a5fe0ca07d/ifx27001_ds_10.pdf
pins: 1 GND, 2 Q, 3 I

## IFX27001TFV33
designator *  value IFX27001TFV33  Reference: U
ki_keywords: LDO positive voltage industrial; ki_description: 1A Low Dropout Regulator, positive, 3.3V fixed output, TO-252-3; ki_fp_filters: TO?252*; Footprint: Package_TO_SOT_SMD:TO-252-3_TabPin2; Datasheet: https://static6.arrow.com/aropdfconversion/dc75757ae45a88e5f69bdce3f2a651a5fe0ca07d/ifx27001_ds_10.pdf
pins: 1 GND, 2 Q, 3 I

## IFX27001TFV50
designator *  value IFX27001TFV50  Reference: U
ki_keywords: LDO positive voltage industrial; ki_description: 1A Low Dropout Regulator, positive, 5.0V fixed output, TO-252-3; ki_fp_filters: TO?252*; Footprint: Package_TO_SOT_SMD:TO-252-3_TabPin2; Datasheet: https://static6.arrow.com/aropdfconversion/dc75757ae45a88e5f69bdce3f2a651a5fe0ca07d/ifx27001_ds_10.pdf
pins: 1 GND, 2 Q, 3 I

## KA78M05_TO252
designator *  value KA78M05_TO252  Reference: U
ki_keywords: Voltage Regulator 500mA Positive; ki_description: Positive 500mA 35V Linear Regulator, Fixed Output 5V, TO-252 (D-PAK); ki_fp_filters: TO?252*; Footprint: Package_TO_SOT_SMD:TO-252-2; Datasheet: https://www.onsemi.com/pub/Collateral/MC78M00-D.PDF
pins: 1 VI, 2 GND, 3 VO

## KA378R05
designator *  value KA378R05  Reference: U
ki_keywords: Voltage Regulator 3A Positive LDO Disable Pin; ki_description: Positive 3A 35V Linear Regulator with Disable Pin, LDO, Fixed Output 5V, TO-220F-4L; ki_fp_filters: TO?220*; Footprint: Package_TO_SOT_THT:TO-220-4_Vertical; Datasheet: https://www.onsemi.com/pub/Collateral/KA378R05-D.pdf
pins: 1 IN, 2 OUT, 3 GND, 4 Vdis

## KA378R12C
designator *  value KA378R12C  Reference: U
ki_keywords: Voltage Regulator 3A Positive LDO Disable Pin; ki_description: Positive 3A 35V Linear Regulator with Disable Pin, LDO, Fixed Output 12V, TO-220F-4L; ki_fp_filters: TO?220*; Footprint: Package_TO_SOT_THT:TO-220-4_Vertical; Datasheet: https://www.onsemi.com/pub/Collateral/KA378R12CTU-D.pdf
pins: 1 IN, 2 OUT, 3 GND, 4 Vdis

## KA378R33
designator *  value KA378R33  Reference: U
ki_keywords: Voltage Regulator 3A Positive LDO Disable Pin; ki_description: Positive 3A 35V Linear Regulator with Disable Pin, LDO, Fixed Output 3.3V, TO-220F-4L; ki_fp_filters: TO?220*; Footprint: Package_TO_SOT_THT:TO-220-4_Vertical; Datasheet: https://www.onsemi.com/pub/Collateral/KA378R33-D.pdf
pins: 1 IN, 2 OUT, 3 GND, 4 Vdis

## KF25BDT
designator *  value KF25BDT  Reference: U
ki_keywords: Voltage Regulator 500mA Positive; ki_description: Positive 500mA 20V Linear Regulator, Fixed Output 2.5V, TO-252 (D-PAK); ki_fp_filters: TO?252*; Footprint: Package_TO_SOT_SMD:TO-252-2; Datasheet: https://www.st.com/resource/en/datasheet/kfxx.pdf
pins: 1 VI, 2 GND, 3 VO

## KF33BDT
designator *  value KF33BDT  Reference: U
ki_keywords: Voltage Regulator 500mA Positive; ki_description: Positive 500mA 20V Linear Regulator, Fixed Output 3.3V, TO-252 (D-PAK); ki_fp_filters: TO?252*; Footprint: Package_TO_SOT_SMD:TO-252-2; Datasheet: https://www.st.com/resource/en/datasheet/kfxx.pdf
pins: 1 VI, 2 GND, 3 VO

## KF50BDT
designator *  value KF50BDT  Reference: U
ki_keywords: Voltage Regulator 500mA Positive; ki_description: Positive 500mA 20V Linear Regulator, Fixed Output 5V, TO-252 (D-PAK); ki_fp_filters: TO?252*; Footprint: Package_TO_SOT_SMD:TO-252-2; Datasheet: https://www.st.com/resource/en/datasheet/kfxx.pdf
pins: 1 VI, 2 GND, 3 VO

## KF80BDT
designator *  value KF80BDT  Reference: U
ki_keywords: Voltage Regulator 500mA Positive; ki_description: Positive 500mA 20V Linear Regulator, Fixed Output 8V, TO-252 (D-PAK); ki_fp_filters: TO?252*; Footprint: Package_TO_SOT_SMD:TO-252-2; Datasheet: https://www.st.com/resource/en/datasheet/kfxx.pdf
pins: 1 VI, 2 GND, 3 VO

## L78L05_SO8
designator *  value L78L05_SO8  Reference: U
ki_keywords: Voltage Regulator 100mA Positive; ki_description: Positive 100mA 30V Linear Regulator, Fixed Output 5V, SO-8; ki_fp_filters: SOIC*3.9x4.9mm*P1.27mm*; Footprint: Package_SO:SOIC-8_3.9x4.9mm_P1.27mm; Datasheet: http://www.st.com/content/ccc/resource/technical/document/datasheet/15/55/e5/aa/23/5b/43/fd/CD00000446.pdf/files/CD00000446.pdf/jcr:content/translations/en.CD00000446.pdf
pins: 1 OUT, 2 GND hidden, 3 GND hidden, 4 NC hidden, 5 NC hidden, 6 GND hidden, 7 GND, 8 IN

## L78L05_SOT89
designator *  value L78L05_SOT89  Reference: U
ki_keywords: Voltage Regulator 100mA Positive; ki_description: Positive 100mA 30V Linear Regulator, Fixed Output 5V, SOT-89; ki_fp_filters: SOT?89*; Footprint: Package_TO_SOT_SMD:SOT-89-3; Datasheet: http://www.st.com/content/ccc/resource/technical/document/datasheet/15/55/e5/aa/23/5b/43/fd/CD00000446.pdf/files/CD00000446.pdf/jcr:content/translations/en.CD00000446.pdf
pins: 1 OUT, 2 GND, 3 IN

## L78L05_TO92
designator *  value L78L05_TO92  Reference: U
ki_keywords: Voltage Regulator 100mA Positive; ki_description: Positive 100mA 30V Linear Regulator, Fixed Output 5V, TO-92; ki_fp_filters: TO?92*; Footprint: Package_TO_SOT_THT:TO-92_Inline; Datasheet: http://www.st.com/content/ccc/resource/technical/document/datasheet/15/55/e5/aa/23/5b/43/fd/CD00000446.pdf/files/CD00000446.pdf/jcr:content/translations/en.CD00000446.pdf
pins: 1 VO, 2 GND, 3 VI

## L78L06_SO8
designator *  value L78L06_SO8  Reference: U
ki_keywords: Voltage Regulator 100mA Positive; ki_description: Positive 100mA 30V Linear Regulator, Fixed Output 6V, SO-8; ki_fp_filters: SOIC*3.9x4.9mm*P1.27mm*; Footprint: Package_SO:SOIC-8_3.9x4.9mm_P1.27mm; Datasheet: http://www.st.com/content/ccc/resource/technical/document/datasheet/15/55/e5/aa/23/5b/43/fd/CD00000446.pdf/files/CD00000446.pdf/jcr:content/translations/en.CD00000446.pdf
pins: 1 OUT, 2 GND hidden, 3 GND hidden, 4 NC hidden, 5 NC hidden, 6 GND hidden, 7 GND, 8 IN

## L78L06_SOT89
designator *  value L78L06_SOT89  Reference: U
ki_keywords: Voltage Regulator 100mA Positive; ki_description: Positive 100mA 30V Linear Regulator, Fixed Output 6V, SOT-89; ki_fp_filters: SOT?89*; Footprint: Package_TO_SOT_SMD:SOT-89-3; Datasheet: http://www.st.com/content/ccc/resource/technical/document/datasheet/15/55/e5/aa/23/5b/43/fd/CD00000446.pdf/files/CD00000446.pdf/jcr:content/translations/en.CD00000446.pdf
pins: 1 OUT, 2 GND, 3 IN

## L78L06_TO92
designator *  value L78L06_TO92  Reference: U
ki_keywords: Voltage Regulator 100mA Positive; ki_description: Positive 100mA 30V Linear Regulator, Fixed Output 6V, TO-92; ki_fp_filters: TO?92*; Footprint: Package_TO_SOT_THT:TO-92_Inline; Datasheet: http://www.st.com/content/ccc/resource/technical/document/datasheet/15/55/e5/aa/23/5b/43/fd/CD00000446.pdf/files/CD00000446.pdf/jcr:content/translations/en.CD00000446.pdf
pins: 1 VO, 2 GND, 3 VI

## L78L08_SO8
designator *  value L78L08_SO8  Reference: U
ki_keywords: Voltage Regulator 100mA Positive; ki_description: Positive 100mA 30V Linear Regulator, Fixed Output 8V, SO-8; ki_fp_filters: SOIC*3.9x4.9mm*P1.27mm*; Footprint: Package_SO:SOIC-8_3.9x4.9mm_P1.27mm; Datasheet: http://www.st.com/content/ccc/resource/technical/document/datasheet/15/55/e5/aa/23/5b/43/fd/CD00000446.pdf/files/CD00000446.pdf/jcr:content/translations/en.CD00000446.pdf
pins: 1 OUT, 2 GND hidden, 3 GND hidden, 4 NC hidden, 5 NC hidden, 6 GND hidden, 7 GND, 8 IN

## L78L08_SOT89
designator *  value L78L08_SOT89  Reference: U
ki_keywords: Voltage Regulator 100mA Positive; ki_description: Positive 100mA 30V Linear Regulator, Fixed Output 8V, SOT-89; ki_fp_filters: SOT?89*; Footprint: Package_TO_SOT_SMD:SOT-89-3; Datasheet: http://www.st.com/content/ccc/resource/technical/document/datasheet/15/55/e5/aa/23/5b/43/fd/CD00000446.pdf/files/CD00000446.pdf/jcr:content/translations/en.CD00000446.pdf
pins: 1 OUT, 2 GND, 3 IN

## L78L08_TO92
designator *  value L78L08_TO92  Reference: U
ki_keywords: Voltage Regulator 100mA Positive; ki_description: Positive 100mA 30V Linear Regulator, Fixed Output 8V, TO-92; ki_fp_filters: TO?92*; Footprint: Package_TO_SOT_THT:TO-92_Inline; Datasheet: http://www.st.com/content/ccc/resource/technical/document/datasheet/15/55/e5/aa/23/5b/43/fd/CD00000446.pdf/files/CD00000446.pdf/jcr:content/translations/en.CD00000446.pdf
pins: 1 VO, 2 GND, 3 VI

## L78L09_SO8
designator *  value L78L09_SO8  Reference: U
ki_keywords: Voltage Regulator 100mA Positive; ki_description: Positive 100mA 30V Linear Regulator, Fixed Output 9V, SO-8; ki_fp_filters: SOIC*3.9x4.9mm*P1.27mm*; Footprint: Package_SO:SOIC-8_3.9x4.9mm_P1.27mm; Datasheet: http://www.st.com/content/ccc/resource/technical/document/datasheet/15/55/e5/aa/23/5b/43/fd/CD00000446.pdf/files/CD00000446.pdf/jcr:content/translations/en.CD00000446.pdf
pins: 1 OUT, 2 GND hidden, 3 GND hidden, 4 NC hidden, 5 NC hidden, 6 GND hidden, 7 GND, 8 IN